# Altium schematic symbol library AliPadash.SchLib: 1186 symbols (part 5 of 6) (continued)
## SIP3 (continued)
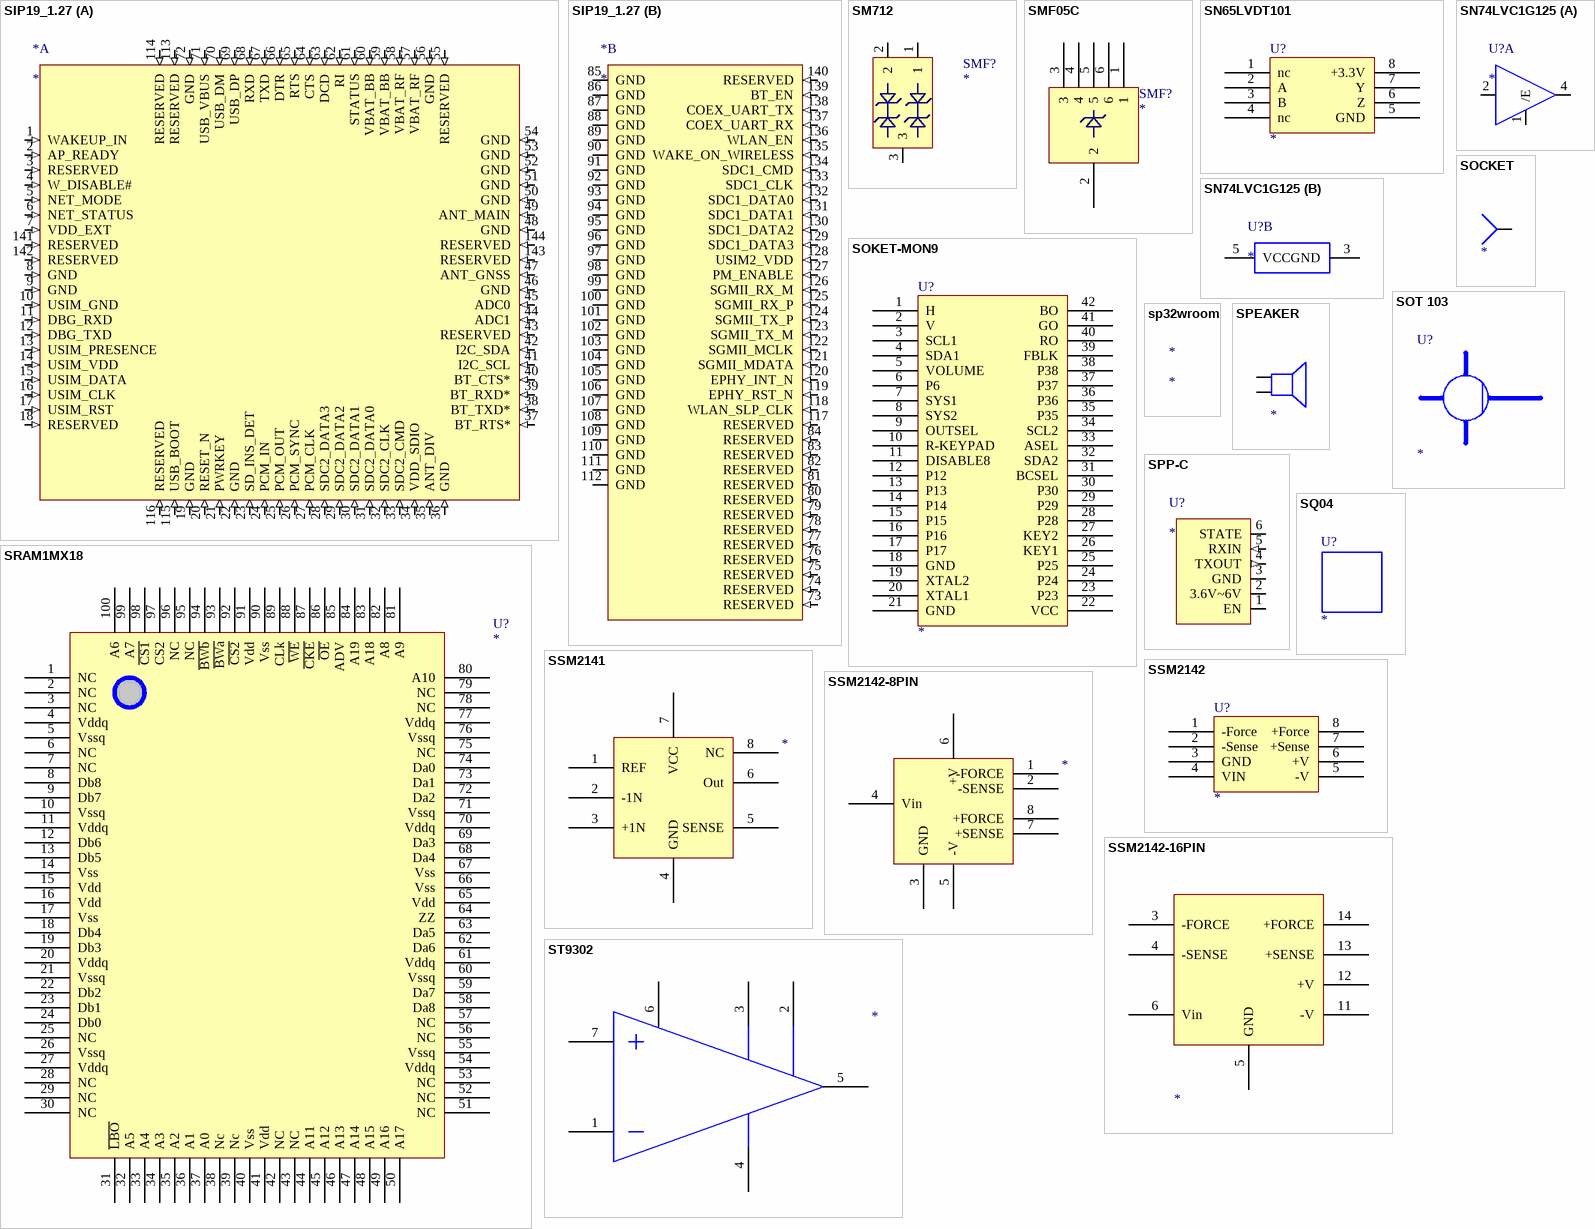
[diagram p59: symbols SIP19_1.27 to ST9302]

## SIP19_1.27
designator *
footprint EC25-E
part A pins: 1 WAKEUP_IN (in), 2 AP_READY (in), 3 RESERVED (in), 4 W_DISABLE# (in), 5 NET_MODE (in), 6 NET_STATUS (in), 7 VDD_EXT (in), 8 GND (in), 9 GND (in), 10 USIM_GND (in), 11 DBG_RXD (in), 12 DBG_TXD (in), 13 USIM_PRESENCE (in), 14 USIM_VDD (in), 15 USIM_DATA (in), 16 USIM_CLK (in), 17 USIM_RST (in), 18 RESERVED (in), 19 GND (in), 20 RESET_N (in), 21 PWRKEY (in), 22 GND (in), 23 SD_INS_DET (in), 24 PCM_IN (in), 25 PCM_OUT (in), 26 PCM_SYNC (in), 27 PCM_CLK (in), 28 SDC2_DATA3 (in), 29 SDC2_DATA2 (in), 30 SDC2_DATA1 (in), 31 SDC2_DATA0 (in), 32 SDC2_CLK (in), 33 SDC2_CMD (in), 34 VDD_SDIO (in), 35 ANT_DIV (in), 36 GND (in), 37 BT_RTS* (in), 38 BT_TXD* (in), 39 BT_RXD* (in), 40 BT_CTS* (in), 41 I2C_SCL (in), 42 I2C_SDA (in), 43 RESERVED (in), 44 ADC1 (in), 45 ADC0 (in), 46 GND (in), 47 ANT_GNSS (in), 48 GND (in), 49 ANT_MAIN (in), 50 GND (in), 51 GND (in), 52 GND (in), 53 GND (in), 54 GND (in), 55 RESERVED (in), 56 GND (in), 57 VBAT_RF (in), 58 VBAT_RF (in), 59 VBAT_BB (in), 60 VBAT_BB (in), 61 STATUS (in), 62 RI (in), 63 DCD (in), 64 CTS (in), 65 RTS (in), 66 DTR (in), 67 TXD (in), 68 RXD (in), 69 USB_DP (in), 70 USB_DM (in), 71 USB_VBUS (in), 72 GND (in), 113 RESERVED (in), 114 RESERVED (in), 115 USB_BOOT (in), 116 RESERVED (in), 141 RESERVED (in), 142 RESERVED (in), 143 RESERVED (in), 144 RESERVED (in)
part B pins: 73 RESERVED (in), 74 RESERVED (in), 75 RESERVED (in), 76 RESERVED (in), 77 RESERVED (in), 78 RESERVED (in), 79 RESERVED (in), 80 RESERVED (in), 81 RESERVED (in), 82 RESERVED (in), 83 RESERVED (in), 84 RESERVED (in), 85 GND (power), 86 GND (power), 87 GND (power), 88 GND (power), 89 GND (power), 90 GND (power), 91 GND (power), 92 GND (power), 93 GND (power), 94 GND (power), 95 GND (power), 96 GND (power), 97 GND (power), 98 GND (power), 99 GND (power), 100 GND (power), 101 GND (power), 102 GND (power), 103 GND (power), 104 GND (power), 105 GND (power), 106 GND (power), 107 GND (power), 108 GND (power), 109 GND (power), 110 GND (power), 111 GND (power), 112 GND (power), 117 RESERVED (in), 118 WLAN_SLP_CLK (in), 119 EPHY_RST_N (in), 120 EPHY_INT_N (in), 121 SGMII_MDATA (in), 122 SGMII_MCLK (in), 123 SGMII_TX_M (in), 124 SGMII_TX_P (in), 125 SGMII_RX_P (in), 126 SGMII_RX_M (in), 127 PM_ENABLE (in), 128 USIM2_VDD (in), 129 SDC1_DATA3 (in), 130 SDC1_DATA2 (in), 131 SDC1_DATA1 (in), 132 SDC1_DATA0 (in), 133 SDC1_CLK (in), 134 SDC1_CMD (in), 135 WAKE_ON_WIRELESS (in), 136 WLAN_EN (in), 137 COEX_UART_RX (in), 138 COEX_UART_TX (in), 139 BT_EN (in), 140 RESERVED (in)

## SM712
designator SMF?
MFAC: SM712; JLC: C521963
footprint SOT-23
pins: 1, 2, 3

## SMF05C
designator SMF?
footprint SC70-6L
pins: 1, 2, 3, 4, 5, 6

## SN65LVDT101
designator U?
footprint PSOP8
pins: 1 nc, 2 A, 3 B, 4 nc, 5 GND, 6 Z, 7 Y, 8 +3.3V

## SN74LVC1G125
designator U?
footprint SOT-25
part A pins: 1 /E, 2 I, 4 O
part B pins: 3 GND, 5 VCC

## SOCKET
designator ?
pins: 1

## SOKET-MON9
designator U?
footprint DIL42B
pins: 1 H, 2 V, 3 SCL1, 4 SDA1, 5 VOLUME, 6 P6, 7 SYS1, 8 SYS2, 9 OUTSEL, 10 R-KEYPAD, 11 DISABLE8, 12 P12, 13 P13, 14 P14, 15 P15, 16 P16, 17 P17, 18 GND, 19 XTAL2, 20 XTAL1, 21 GND, 22 VCC, 23 P23, 24 P24, 25 P25, 26 KEY1, 27 KEY2, 28 P28, 29 P29, 30 P30, 31 BCSEL, 32 SDA2, 33 ASEL, 34 SCL2, 35 P35, 36 P36, 37 P37, 38 P38, 39 FBLK, 40 RO, 41 GO, 42 BO

## SOT 103
designator U?

## sp32wroom
designator *

## SPEAKER
designator ?
pins: 1, 2

## SPP-C
designator U?
footprint BLUE (Footprint not found)
pins: 1 EN, 2 3.6V~6V, 3 GND, 4 TXOUT (out), 5 RXIN (in), 6 STATE

## SQ04
designator U?

## SRAM1MX18
designator U?
footprint TQFP-100
pins: 1 NC (power), 2 NC (power), 3 NC (power), 4 Vddq (power), 5 Vssq (power), 6 NC (power), 7 NC (power), 8 Db8 (power), 9 Db7 (power), 10 Vssq (power), 11 Vddq (power), 12 Db6 (power), 13 Db5 (power), 14 Vss (power), 15 Vdd (power), 16 Vdd (power), 17 Vss (power), 18 Db4 (power), 19 Db3 (power), 20 Vddq (power), 21 Vssq (power), 22 Db2 (power), 23 Db1 (power), 24 Db0 (power), 25 NC (power), 26 Vssq (power), 27 Vddq (power), 28 NC (power), 29 NC (power), 30 NC (power), 31 ~{LBO} (power), 32 A5 (power), 33 A4 (power), 34 A3 (power), 35 A2 (power), 36 A1 (power), 37 A0 (power), 38 Nc (power), 39 Nc (power), 40 Vss (power), 41 Vdd (power), 42 NC (power), 43 NC (power), 44 A11 (power), 45 A12 (power), 46 A13 (power), 47 A14 (power), 48 A15 (power), 49 A16 (power), 50 A17 (power), 51 NC (power), 52 NC (power), 53 NC (power), 54 Vddq (power), 55 Vssq (power), 56 NC (power), 57 NC (power), 58 Da8 (power), 59 Da7 (power), 60 Vssq (power), 61 Vddq (power), 62 Da6 (power), 63 Da5 (power), 64 ZZ (power), 65 Vdd (power), 66 Vss (power), 67 Vss (power), 68 Da4 (power), 69 Da3 (power), 70 Vddq (power), 71 Vssq (power), 72 Da2 (power), 73 Da1 (power), 74 Da0 (power), 75 NC (power), 76 Vssq (power), 77 Vddq (power), 78 NC (power), 79 NC (power), 80 A10 (power), 81 A9 (power), 82 A8 (power), 83 A18 (power), 84 A19 (power), 85 ADV (power), 86 ~{OE} (power), 87 ~{CKE} (power), 88 ~{WE} (power), 89 CLk (power), 90 Vss (power), 91 Vdd (power), 92 ~{CS2} (power), 93 ~{BWa} (power), 94 ~{BWb} (power), 95 NC (power), 96 NC (power), 97 CS2 (power), 98 ~{CS1} (power), 99 A7 (power), 100 A6 (power)

## SSM2141
designator ?
U?
footprint DIP8
pins: 1 REF, 2 -1N, 3 +1N, 4 GND (power), 5 SENSE, 6 Out, 7 VCC (power), 8 NC

## SSM2142
designator U?
footprint DIP8
pins: 1 -Force, 2 -Sense, 3 GND, 4 VIN, 5 -V, 6 +V, 7 +Sense, 8 +Force

## SSM2142-8PIN
designator ?
U?
footprint DIP8
pins: 1 -FORCE, 2 -SENSE, 3 GND (power), 4 Vin, 5 -V, 6 +V, 7 +SENSE, 8 +FORCE

## SSM2142-16PIN
designator ?
U?
footprint DIP16
pins: 3 -FORCE, 4 -SENSE, 5 GND (power), 6 Vin, 11 -V, 12 +V, 13 +SENSE, 14 +FORCE

## ST9302
designator ?
pins: 1, 2, 3, 4, 5, 6, 7

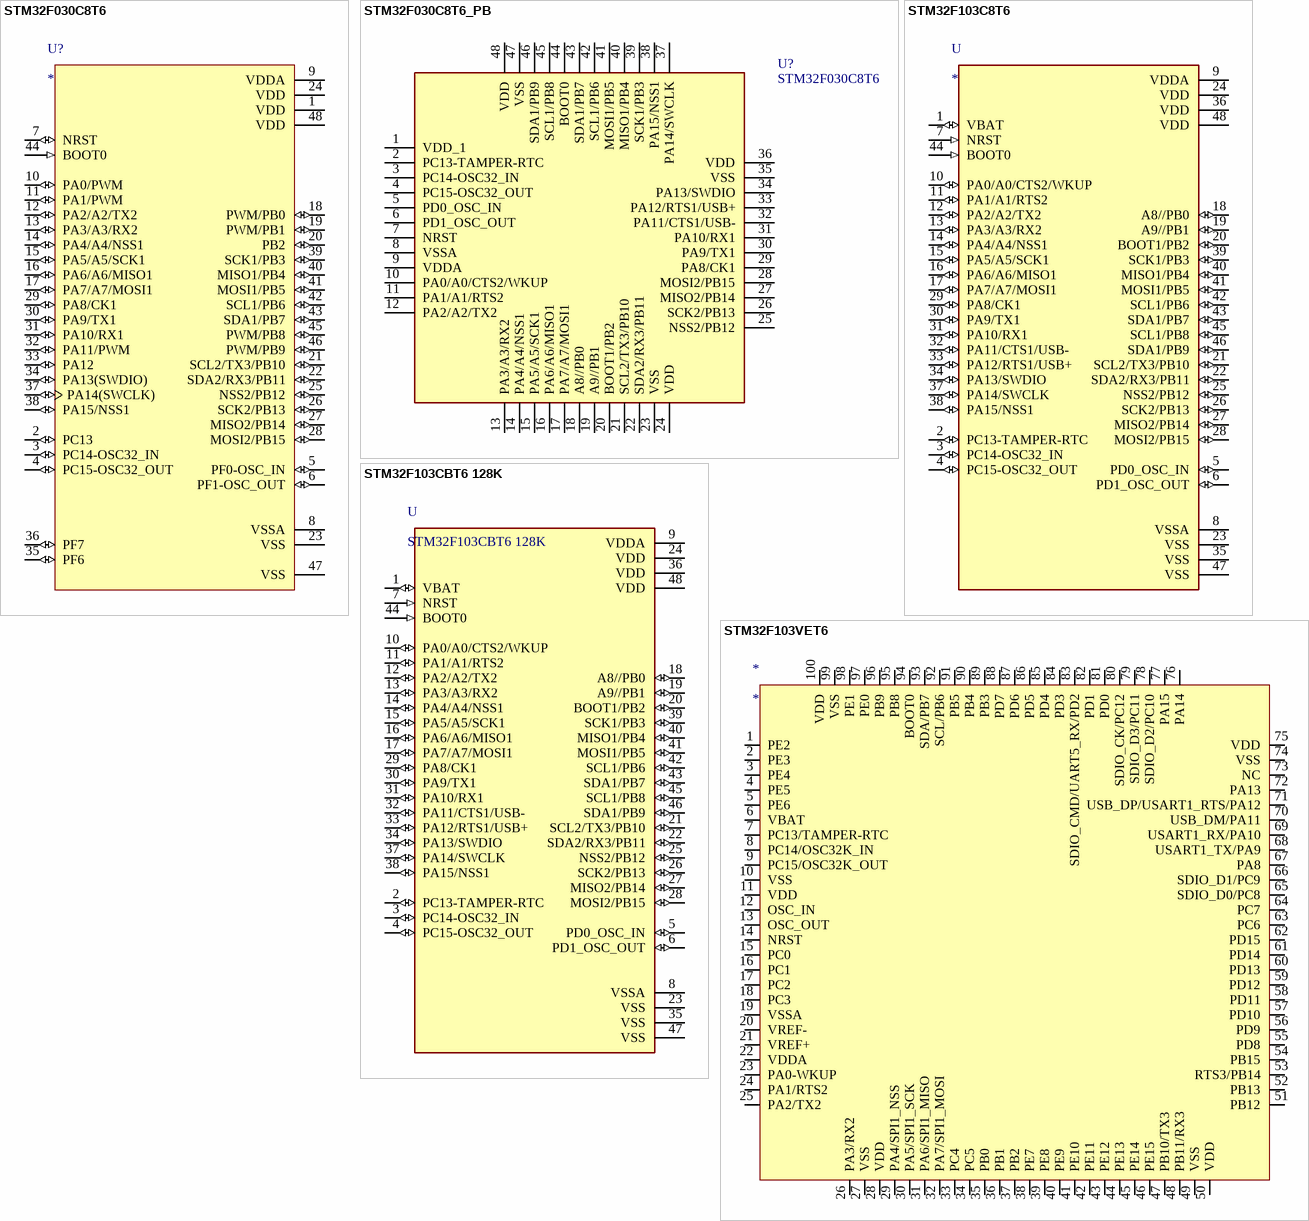
[diagram p60: symbols STM32F030C8T6 to STM32F103VET6]

## STM32F030C8T6
designator U?
footprint LQFP48
pins: 1 VDD (power), 2 PC13 (io), 3 PC14-OSC32_IN (io), 4 PC15-OSC32_OUT (io), 5 PF0-OSC_IN (io), 6 PF1-OSC_OUT (io), 7 NRST (io), 8 VSSA (power), 9 VDDA (power), 10 PA0/PWM (io), 11 PA1/PWM (io), 12 PA2/A2/TX2 (io), 13 PA3/A3/RX2 (io), 14 PA4/A4/NSS1 (io), 15 PA5/A5/SCK1 (io), 16 PA6/A6/MISO1 (io), 17 PA7/A7/MOSI1 (io), 18 PWM/PB0 (io), 19 PWM/PB1 (io), 20 PB2 (io), 21 SCL2/TX3/PB10 (io), 22 SDA2/RX3/PB11 (io), 23 VSS (power), 24 VDD (power), 25 NSS2/PB12 (io), 26 SCK2/PB13 (io), 27 MISO2/PB14 (io), 28 MOSI2/PB15 (io), 29 PA8/CK1 (io), 30 PA9/TX1 (io), 31 PA10/RX1 (io), 32 PA11/PWM (io), 33 PA12 (io), 34 PA13(SWDIO) (io), 35 PF6 (io), 36 PF7 (io), 37 PA14(SWCLK) (io), 38 PA15/NSS1 (io), 39 SCK1/PB3 (io), 40 MISO1/PB4 (io), 41 MOSI1/PB5 (io), 42 SCL1/PB6 (io), 43 SDA1/PB7 (io), 44 BOOT0 (in), 45 PWM/PB8 (io), 46 PWM/PB9 (io), 47 VSS (power), 48 VDD (power)

## STM32F030C8T6_PB
designator U?, comment STM32F030C8T6
JLC: C23922; MFAC: STM32F030C8T6
footprint LQFP48
pins: 1 VDD_1, 2 PC13-TAMPER-RTC, 3 PC14-OSC32_IN, 4 PC15-OSC32_OUT, 5 PD0_OSC_IN, 6 PD1_OSC_OUT, 7 NRST, 8 VSSA, 9 VDDA, 10 PA0/A0/CTS2/WKUP, 11 PA1/A1/RTS2, 12 PA2/A2/TX2, 13 PA3/A3/RX2, 14 PA4/A4/NSS1, 15 PA5/A5/SCK1, 16 PA6/A6/MISO1, 17 PA7/A7/MOSI1, 18 A8//PB0, 19 A9//PB1, 20 BOOT1/PB2, 21 SCL2/TX3/PB10, 22 SDA2/RX3/PB11, 23 VSS, 24 VDD, 25 NSS2/PB12, 26 SCK2/PB13, 27 MISO2/PB14, 28 MOSI2/PB15, 29 PA8/CK1, 30 PA9/TX1, 31 PA10/RX1, 32 PA11/CTS1/USB-, 33 PA12/RTS1/USB+, 34 PA13/SWDIO, 35 VSS, 36 VDD, 37 PA14/SWCLK, 38 PA15/NSS1, 39 SCK1/PB3, 40 MISO1/PB4, 41 MOSI1/PB5, 42 SCL1/PB6, 43 SDA1/PB7, 44 BOOT0, 45 SCL1/PB8, 46 SDA1/PB9, 47 VSS, 48 VDD

## STM32F103C8T6
designator U
M3 STM32F1 Microcontroller IC 32-Bit 72MHz 64KB _64K x 8_ FLASH; MP: STM32F103C8T6; MF: STMicroelectronics; Price: None; Package: LQFP-48 STMicroelectronics; Value: *; Availability: Unavailable; SnapEDA_Link: https://www.snapeda.com/parts/STM32F103C8T6/STMicroelectronics/view-part/52195/?ref=snap; JLC: C8734; MFAC: STM32F103C8T6
footprint QFP50P900X900X160-48N
pins: 1 VBAT (io), 2 PC13-TAMPER-RTC (io), 3 PC14-OSC32_IN (io), 4 PC15-OSC32_OUT (io), 5 PD0_OSC_IN (io), 6 PD1_OSC_OUT (io), 7 NRST (in), 8 VSSA (power), 9 VDDA (power), 10 PA0/A0/CTS2/WKUP (io), 11 PA1/A1/RTS2 (io), 12 PA2/A2/TX2 (io), 13 PA3/A3/RX2 (io), 14 PA4/A4/NSS1 (io), 15 PA5/A5/SCK1 (io), 16 PA6/A6/MISO1 (io), 17 PA7/A7/MOSI1 (io), 18 A8//PB0 (io), 19 A9//PB1 (io), 20 BOOT1/PB2 (io), 21 SCL2/TX3/PB10 (io), 22 SDA2/RX3/PB11 (io), 23 VSS (power), 24 VDD (power), 25 NSS2/PB12 (io), 26 SCK2/PB13 (io), 27 MISO2/PB14 (io), 28 MOSI2/PB15 (io), 29 PA8/CK1 (io), 30 PA9/TX1 (io), 31 PA10/RX1 (io), 32 PA11/CTS1/USB- (io), 33 PA12/RTS1/USB+ (io), 34 PA13/SWDIO (io), 35 VSS (power), 36 VDD (power), 37 PA14/SWCLK (io), 38 PA15/NSS1 (io), 39 SCK1/PB3 (io), 40 MISO1/PB4 (io), 41 MOSI1/PB5 (io), 42 SCL1/PB6 (io), 43 SDA1/PB7 (io), 44 BOOT0 (in), 45 SCL1/PB8 (io), 46 SDA1/PB9 (io), 47 VSS (power), 48 VDD (power)

## STM32F103CBT6 128K
designator U
M3 STM32F1 Microcontroller IC 32-Bit 72MHz 64KB _64K x 8_ FLASH; MP: STM32F103C8T6; MF: STMicroelectronics; Price: None; Package: LQFP-48 STMicroelectronics; Value: *; Availability: Unavailable; SnapEDA_Link: https://www.snapeda.com/parts/STM32F103C8T6/STMicroelectronics/view-part/52195/?ref=snap; JLC: C8304; MFAC: STM32F103CBT6
footprint LQFP48 (Footprint not found)
pins: 1 VBAT (io), 2 PC13-TAMPER-RTC (io), 3 PC14-OSC32_IN (io), 4 PC15-OSC32_OUT (io), 5 PD0_OSC_IN (io), 6 PD1_OSC_OUT (io), 7 NRST (in), 8 VSSA (power), 9 VDDA (power), 10 PA0/A0/CTS2/WKUP (io), 11 PA1/A1/RTS2 (io), 12 PA2/A2/TX2 (io), 13 PA3/A3/RX2 (io), 14 PA4/A4/NSS1 (io), 15 PA5/A5/SCK1 (io), 16 PA6/A6/MISO1 (io), 17 PA7/A7/MOSI1 (io), 18 A8//PB0 (io), 19 A9//PB1 (io), 20 BOOT1/PB2 (io), 21 SCL2/TX3/PB10 (io), 22 SDA2/RX3/PB11 (io), 23 VSS (power), 24 VDD (power), 25 NSS2/PB12 (io), 26 SCK2/PB13 (io), 27 MISO2/PB14 (io), 28 MOSI2/PB15 (io), 29 PA8/CK1 (io), 30 PA9/TX1 (io), 31 PA10/RX1 (io), 32 PA11/CTS1/USB- (io), 33 PA12/RTS1/USB+ (io), 34 PA13/SWDIO (io), 35 VSS (power), 36 VDD (power), 37 PA14/SWCLK (io), 38 PA15/NSS1 (io), 39 SCK1/PB3 (io), 40 MISO1/PB4 (io), 41 MOSI1/PB5 (io), 42 SCL1/PB6 (io), 43 SDA1/PB7 (io), 44 BOOT0 (in), 45 SCL1/PB8 (io), 46 SDA1/PB9 (io), 47 VSS (power), 48 VDD (power)

## STM32F103VET6
designator *
MFAC: STM32F103VET6; JLC: C8308
footprint LQFP-100_L14.0-W14.0-P0.50-LS16.0-BL
pins: 1 PE2, 2 PE3, 3 PE4, 4 PE5, 5 PE6, 6 VBAT, 7 PC13/TAMPER-RTC, 8 PC14/OSC32K_IN, 9 PC15/OSC32K_OUT, 10 VSS, 11 VDD, 12 OSC_IN, 13 OSC_OUT, 14 NRST, 15 PC0, 16 PC1, 17 PC2, 18 PC3, 19 VSSA, 20 VREF-, 21 VREF+, 22 VDDA, 23 PA0-WKUP, 24 PA1/RTS2, 25 PA2/TX2, 26 PA3/RX2, 27 VSS, 28 VDD, 29 PA4/SPI1_NSS, 30 PA5/SPI1_SCK, 31 PA6/SPI1_MISO, 32 PA7/SPI1_MOSI, 33 PC4, 34 PC5, 35 PB0, 36 PB1, 37 PB2, 38 PE7, 39 PE8, 40 PE9, 41 PE10, 42 PE11, 43 PE12, 44 PE13, 45 PE14, 46 PE15, 47 PB10/TX3, 48 PB11/RX3, 49 VSS, 50 VDD, 51 PB12, 52 PB13, 53 RTS3/PB14, 54 PB15, 55 PD8, 56 PD9, 57 PD10, 58 PD11, 59 PD12, 60 PD13, 61 PD14, 62 PD15, 63 PC6, 64 PC7, 65 SDIO_D0/PC8, 66 SDIO_D1/PC9, 67 PA8, 68 USART1_TX/PA9, 69 USART1_RX/PA10, 70 USB_DM/PA11, 71 USB_DP/USART1_RTS/PA12, 72 PA13, 73 NC, 74 VSS, 75 VDD, 76 PA14, 77 PA15, 78 SDIO_D2/PC10, 79 SDIO_D3/PC11, 80 SDIO_CK/PC12, 81 PD0, 82 PD1, 83 SDIO_CMD/UART5_RX/PD2, 84 PD3, 85 PD4, 86 PD5, 87 PD6, 88 PD7, 89 PB3, 90 PB4, 91 PB5, 92 SCL/PB6, 93 SDA/PB7, 94 BOOT0, 95 PB8, 96 PB9, 97 PE0, 98 PE1, 99 VSS, 100 VDD

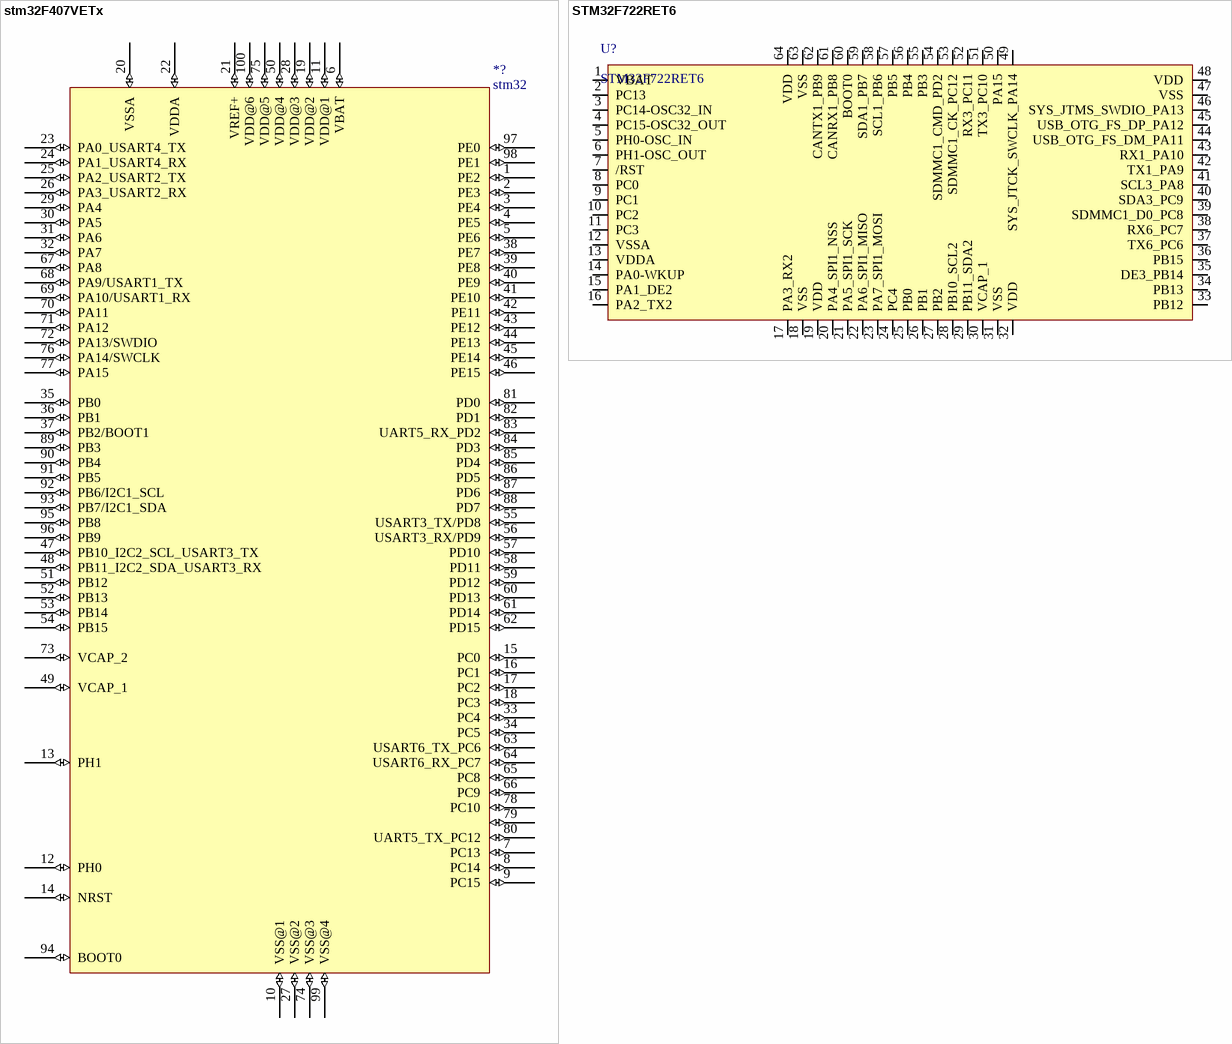
[diagram p61: symbols stm32F407VETx to STM32F722RET6]

## stm32F407VETx
designator *?, comment stm32
footprint LQFP100
footprint LQFP100
pins: 1 PE2 (io), 2 PE3 (io), 3 PE4 (io), 4 PE5 (io), 5 PE6 (io), 6 VBAT (io), 7 PC13 (io), 8 PC14 (io), 9 PC15 (io), 10 VSS@1 (io), 11 VDD@1 (io), 12 PH0 (io), 13 PH1 (io), 14 NRST (io), 15 PC0 (io), 16 PC1 (io), 17 PC2 (io), 18 PC3 (io), 19 VDD@2 (io), 20 VSSA (io), 21 VREF+ (io), 22 VDDA (io), 23 PA0_USART4_TX (io), 24 PA1_USART4_RX (io), 25 PA2_USART2_TX (io), 26 PA3_USART2_RX (io), 27 VSS@2 (io), 28 VDD@3 (io), 29 PA4 (io), 30 PA5 (io), 31 PA6 (io), 32 PA7 (io), 33 PC4 (io), 34 PC5 (io), 35 PB0 (io), 36 PB1 (io), 37 PB2/BOOT1 (io), 38 PE7 (io), 39 PE8 (io), 40 PE9 (io), 41 PE10 (io), 42 PE11 (io), 43 PE12 (io), 44 PE13 (io), 45 PE14 (io), 46 PE15 (io), 47 PB10_I2C2_SCL_USART3_TX (io), 48 PB11_I2C2_SDA_USART3_RX (io), 49 VCAP_1 (io), 50 VDD@4 (io), 51 PB12 (io), 52 PB13 (io), 53 PB14 (io), 54 PB15 (io), 55 USART3_TX/PD8 (io), 56 USART3_RX/PD9 (io), 57 PD10 (io), 58 PD11 (io), 59 PD12 (io), 60 PD13 (io), 61 PD14 (io), 62 PD15 (io), 63 USART6_TX_PC6 (io), 64 USART6_RX_PC7 (io), 65 PC8 (io), 66 PC9 (io), 67 PA8 (io), 68 PA9/USART1_TX (io), 69 PA10/USART1_RX (io), 70 PA11 (io), 71 PA12 (io), 72 PA13/SWDIO (io), 73 VCAP_2 (io), 74 VSS@3 (io), 75 VDD@5 (io), 76 PA14/SWCLK (io), 77 PA15 (io), 78 PC10 (io), 79 PC11 (io), 80 UART5_TX_PC12 (io), 81 PD0 (io), 82 PD1 (io), 83 UART5_RX_PD2 (io), 84 PD3 (io), 85 PD4 (io), 86 PD5 (io), 87 PD6 (io), 88 PD7 (io), 89 PB3 (io), 90 PB4 (io), 91 PB5 (io), 92 PB6/I2C1_SCL (io), 93 PB7/I2C1_SDA (io), 94 BOOT0 (io), 95 PB8 (io), 96 PB9 (io), 97 PE0 (io), 98 PE1 (io), 99 VSS@4 (io), 100 VDD@6 (io)

## STM32F722RET6
designator U?
JLC: C118207; MFAC: STM32F722RET6
footprint LQFP64
pins: 1 VBAT, 2 PC13, 3 PC14-OSC32_IN, 4 PC15-OSC32_OUT, 5 PH0-OSC_IN, 6 PH1-OSC_OUT, 7 /RST, 8 PC0, 9 PC1, 10 PC2, 11 PC3, 12 VSSA, 13 VDDA, 14 PA0-WKUP, 15 PA1_DE2, 16 PA2_TX2, 17 PA3_RX2, 18 VSS, 19 VDD, 20 PA4_SPI1_NSS, 21 PA5_SPI1_SCK, 22 PA6_SPI1_MISO, 23 PA7_SPI1_MOSI, 24 PC4, 25 PB0, 26 PB1, 27 PB2, 28 PB10_SCL2, 29 PB11_SDA2, 30 VCAP_1, 31 VSS, 32 VDD, 33 PB12, 34 PB13, 35 DE3_PB14, 36 PB15, 37 TX6_PC6, 38 RX6_PC7, 39 SDMMC1_D0_PC8, 40 SDA3_PC9, 41 SCL3_PA8, 42 TX1_PA9, 43 RX1_PA10, 44 USB_OTG_FS_DM_PA11, 45 USB_OTG_FS_DP_PA12, 46 SYS_JTMS_SWDIO_PA13, 47 VSS, 48 VDD, 49 SYS_JTCK_SWCLK_PA14, 50 PA15, 51 TX3_PC10, 52 RX3_PC11, 53 SDMMC1_CK_PC12, 54 SDMMC1_CMD_PD2, 55 PB3, 56 PB4, 57 PB5, 58 SCL1_PB6, 59 SDA1_PB7, 60 BOOT0, 61 CANRX1_PB8, 62 CANTX1_PB9, 63 VSS, 64 VDD

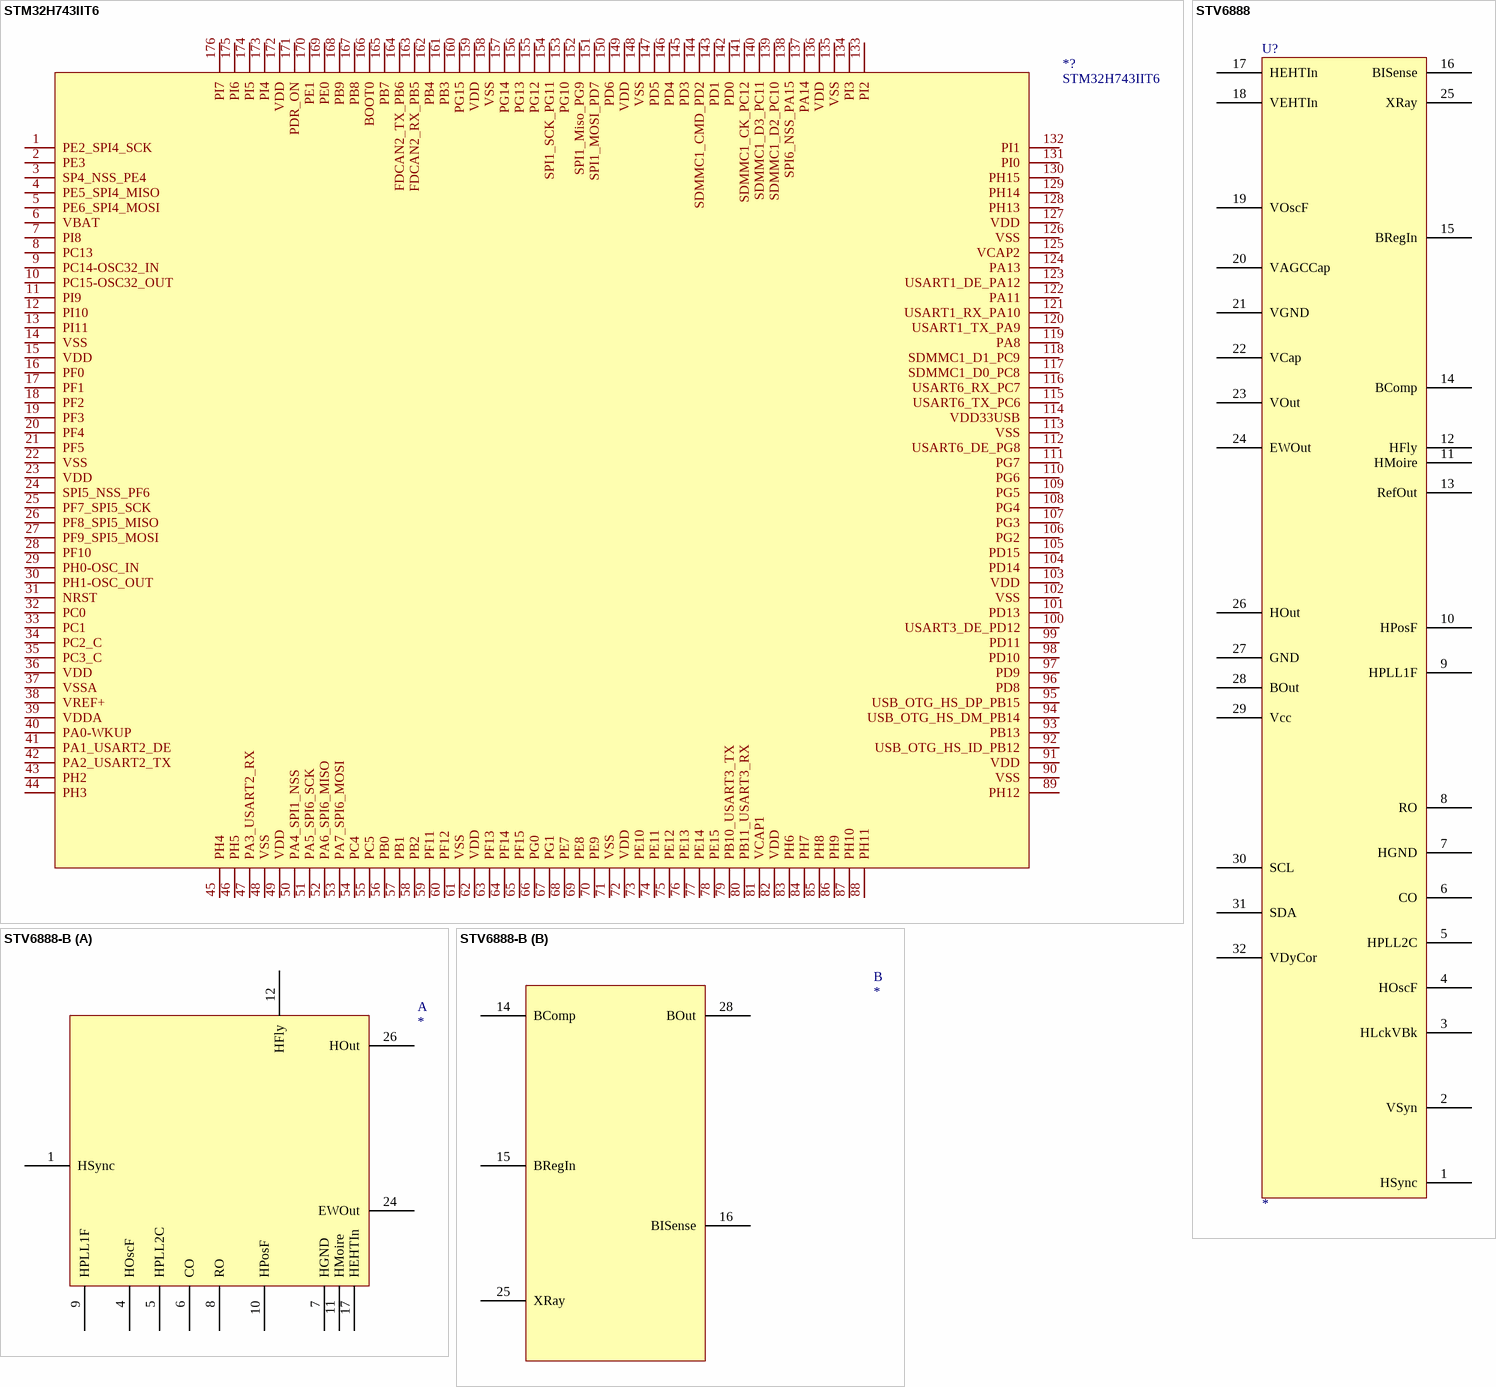
[diagram p62: symbols STM32H743IIT6 to STV6888-B]

## STM32H743IIT6
designator *?
JLC: C89597; MFAC: STM32H743IIT6
footprint LQFP-176_L24.0-W24.0-P0.50-LS26.0-BL (Footprint not found)
pins: 1 PE2_SPI4_SCK, 2 PE3, 3 SP4_NSS_PE4, 4 PE5_SPI4_MISO, 5 PE6_SPI4_MOSI, 6 VBAT, 7 PI8, 8 PC13, 9 PC14-OSC32_IN, 10 PC15-OSC32_OUT, 11 PI9, 12 PI10, 13 PI11, 14 VSS, 15 VDD, 16 PF0, 17 PF1, 18 PF2, 19 PF3, 20 PF4, 21 PF5, 22 VSS, 23 VDD, 24 SPI5_NSS_PF6, 25 PF7_SPI5_SCK, 26 PF8_SPI5_MISO, 27 PF9_SPI5_MOSI, 28 PF10, 29 PH0-OSC_IN, 30 PH1-OSC_OUT, 31 NRST, 32 PC0, 33 PC1, 34 PC2_C, 35 PC3_C, 36 VDD, 37 VSSA, 38 VREF+, 39 VDDA, 40 PA0-WKUP, 41 PA1_USART2_DE, 42 PA2_USART2_TX, 43 PH2, 44 PH3, 45 PH4, 46 PH5, 47 PA3_USART2_RX, 48 VSS, 49 VDD, 50 PA4_SPI1_NSS, 51 PA5_SPI6_SCK, 52 PA6_SPI6_MISO, 53 PA7_SPI6_MOSI, 54 PC4, 55 PC5, 56 PB0, 57 PB1, 58 PB2, 59 PF11, 60 PF12, 61 VSS, 62 VDD, 63 PF13, 64 PF14, 65 PF15, 66 PG0, 67 PG1, 68 PE7, 69 PE8, 70 PE9, 71 VSS, 72 VDD, 73 PE10, 74 PE11, 75 PE12, 76 PE13, 77 PE14, 78 PE15, 79 PB10_USART3_TX, 80 PB11_USART3_RX, 81 VCAP1, 82 VDD, 83 PH6, 84 PH7, 85 PH8, 86 PH9, 87 PH10, 88 PH11, 89 PH12, 90 VSS, 91 VDD, 92 USB_OTG_HS_ID_PB12, 93 PB13, 94 USB_OTG_HS_DM_PB14, 95 USB_OTG_HS_DP_PB15, 96 PD8, 97 PD9, 98 PD10, 99 PD11, 100 USART3_DE_PD12, 101 PD13, 102 VSS, 103 VDD, 104 PD14, 105 PD15, 106 PG2, 107 PG3, 108 PG4, 109 PG5, 110 PG6, 111 PG7, 112 USART6_DE_PG8, 113 VSS, 114 VDD33USB, 115 USART6_TX_PC6, 116 USART6_RX_PC7, 117 SDMMC1_D0_PC8, 118 SDMMC1_D1_PC9, 119 PA8, 120 USART1_TX_PA9, 121 USART1_RX_PA10, 122 PA11, 123 USART1_DE_PA12, 124 PA13, 125 VCAP2, 126 VSS, 127 VDD, 128 PH13, 129 PH14, 130 PH15, 131 PI0, 132 PI1, 133 PI2, 134 PI3, 135 VSS, 136 VDD, 137 PA14, 138 SPI6_NSS_PA15, 139 SDMMC1_D2_PC10, 140 SDMMC1_D3_PC11, 141 SDMMC1_CK_PC12, 142 PD0, 143 PD1, 144 SDMMC1_CMD_PD2, 145 PD3, 146 PD4, 147 PD5, 148 VSS, 149 VDD, 150 PD6, 151 SPI1_MOSI_PD7, 152 SPI1_Miso_PG9, 153 PG10, 154 SPI1_SCK_PG11, 155 PG12, 156 PG13, 157 PG14, 158 VSS, 159 VDD, 160 PG15, 161 PB3, 162 PB4, 163 FDCAN2_RX_PB5, 164 FDCAN2_TX_PB6, 165 PB7, 166 BOOT0, 167 PB8, 168 PB9, 169 PE0, 170 PE1, 171 PDR_ON, 172 VDD, 173 PI4, 174 PI5, 175 PI6, 176 PI7

## STV6888
designator U?
pins: 1 HSync, 2 VSyn, 3 HLckVBk, 4 HOscF, 5 HPLL2C, 6 CO, 7 HGND, 8 RO, 9 HPLL1F, 10 HPosF, 11 HMoire, 12 HFly, 13 RefOut, 14 BComp, 15 BRegIn, 16 BISense, 17 HEHTIn, 18 VEHTIn, 19 VOscF, 20 VAGCCap, 21 VGND, 22 VCap, 23 VOut, 24 EWOut, 25 XRay, 26 HOut, 27 GND, 28 BOut, 29 Vcc, 30 SCL, 31 SDA, 32 VDyCor
